# Altium footprint library Led & Displays.PcbLib: 52 footprints (part 3 of 4)
Each footprint in its own frame and in the unit in brackets; x right, y up, seen from the top. Pads: shape width x height; smd on the part's side, far side on the other; paste and mask are expansions set on the pad; w line width, h text height; cw(c..) or ccw(c..) is an arc to the next point about the centre after c.
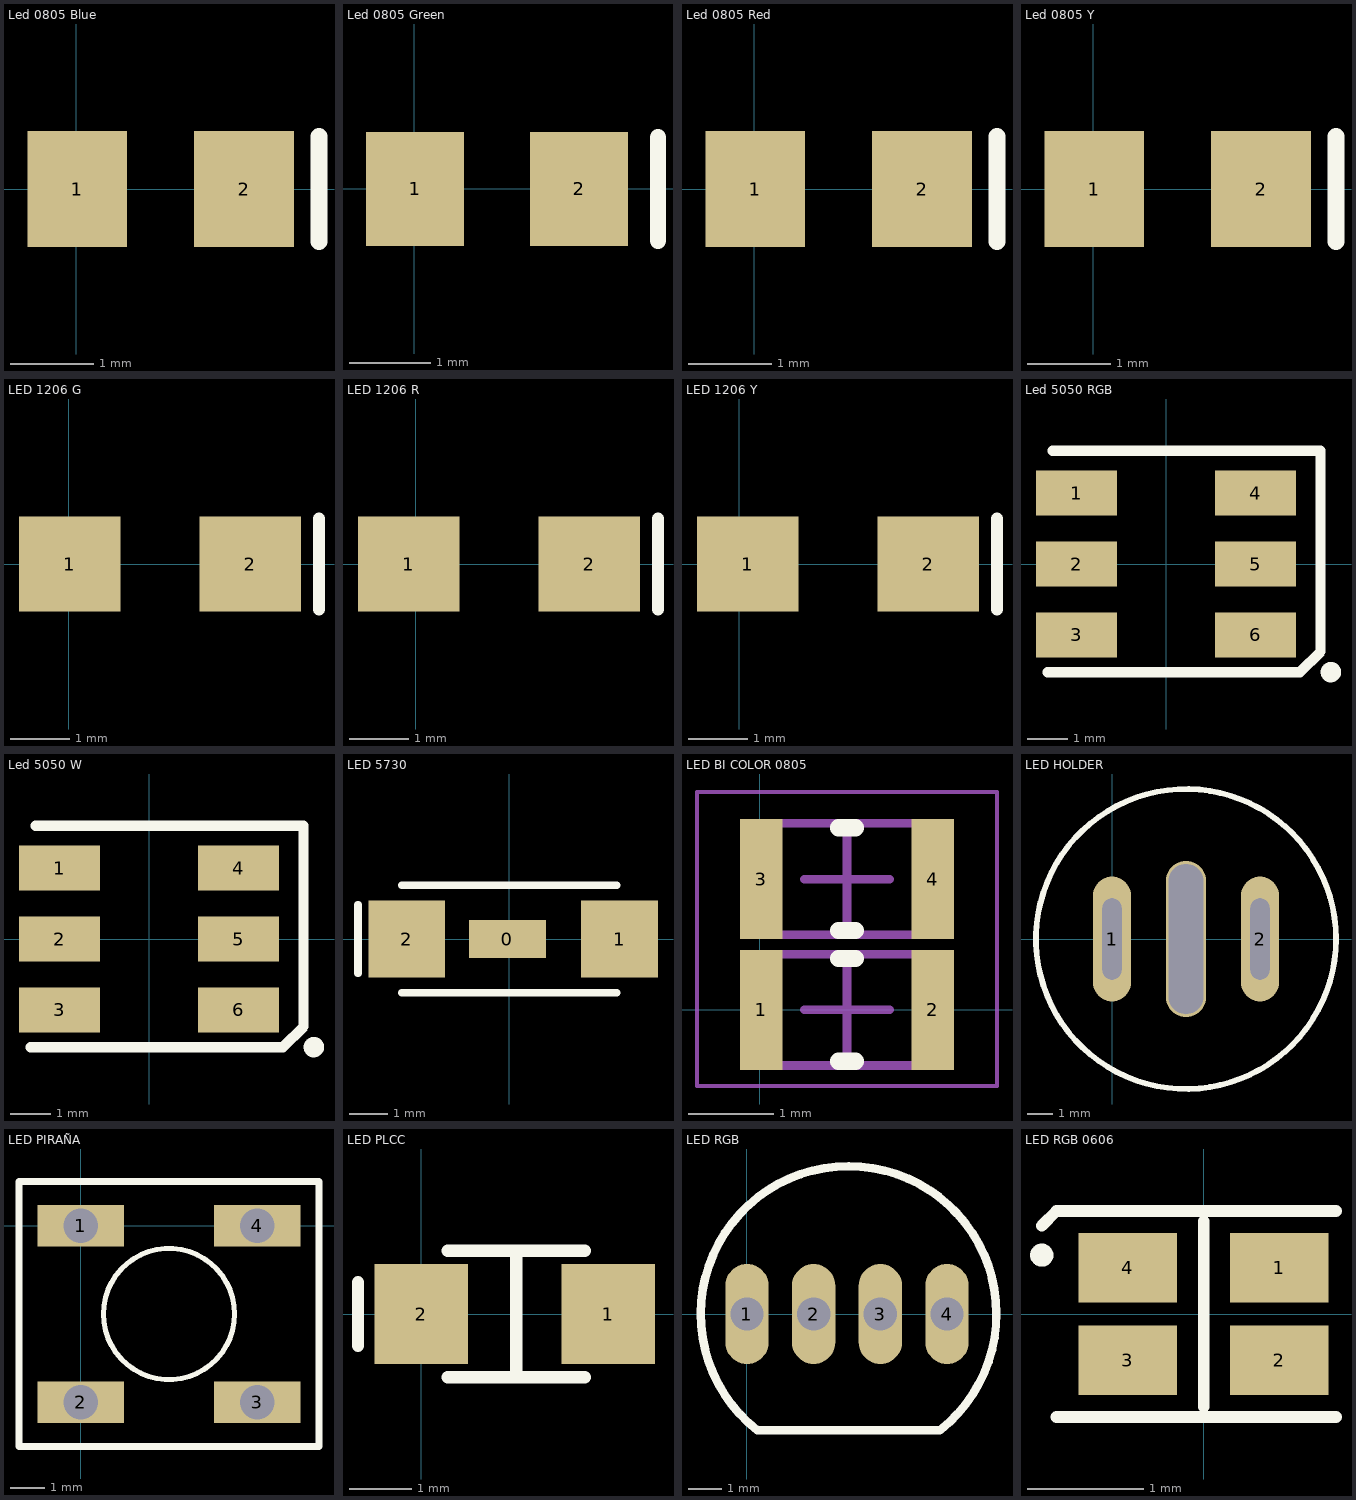
[diagram p2: the footprints below, top view; thin cyan lines are the x and y axes]

## Led 0805 Blue [mm] "Led SMD 0805 Azul"
pads (2):
  rect 1.2x1.4 smd: 1(0.012,0) 2(2.02,0)
Top Overlay:
  lines w0.2: 2.921,-0.635 2.921,0.635
3D body "l0805blue.step": height 1.13, standoff 0.02, extent 0.016,-0.625 2.016,0.625

## Led 0805 Green [mm] "Led SMD 0805 Verde"
pads (2):
  rect 1.2x1.4 smd: 1(0.012,0) 2(2.02,0)
Top Overlay:
  lines w0.2: 2.984,-0.635 2.984,0.635
3D body "l0805g.step": height 1.13, standoff 0.02, extent 0.016,-0.625 2.016,0.625

## Led 0805 Red [mm] "Led SMD 0805 Rojo"
pads (2):
  rect 1.2x1.4 smd: 1(0.012,0) 2(2.02,0)
Top Overlay:
  lines w0.2: 2.921,-0.635 2.921,0.635
3D body "l0805r.step": height 1.13, standoff 0.02, extent 0.016,-0.625 2.016,0.625

## Led 0805 Y [mm] "Led SMD 0805"
pads (2):
  rect 1.2x1.4 smd: 1(0.012,0) 2(2.02,0)
Top Overlay:
  lines w0.2: 2.921,-0.635 2.921,0.635
3D body "LED 0805.step": height 1.1, standoff 0, extent 0.006,-0.625 2.026,0.625

## LED 1206 G [mm] "Led SMD 1206"
pads (2):
  rect 1.7x1.6 smd: 1(0.012,0) 2(3.036,0)
Top Overlay:
  lines w0.2: 4.191,-0.762 4.191,0.762
3D body "LED 1206 BLUE.step": height 1.1, standoff 0, extent -0.203,-0.8 2.997,0.8

## LED 1206 R [mm]
pads (2):
  rect 1.7x1.6 smd: 1(-0.115,0) 2(2.909,0)
Top Overlay:
  lines w0.2: 4.064,-0.762 4.064,0.762
3D body "LED1206R.STEP": height 1.11, standoff -0.4, extent -0.203,-0.787 2.997,0.813

## LED 1206 Y [mm]
pads (2):
  rect 1.7x1.6 smd: 1(0.139,0) 2(3.163,0)
Top Overlay:
  lines w0.2: 4.318,-0.762 4.318,0.762
3D body "LED1206Y.STEP": height 1.11, standoff -0.4, extent 0.051,-0.787 3.251,0.813

## Led 5050 RGB [mm] "Led 5050 RGB"
pads (6):
  rect 2x1.1 smd: 1(-2.208,1.75) 2(-2.208,0) 3(-2.208,-1.75) 4(2.208,1.75) 5(2.208,0) 6(2.208,-1.75)
Top Overlay:
  circle w0.25: c4.064,-2.667 r0.127
  lines w0.254: -2.921,-2.667 3.302,-2.667 3.81,-2.159 3.81,2.794 -2.794,2.794
3D body "Led 5050 RGB.STEP": height 1.6, standoff 0, extent -2.77,-2.54 2.77,2.56

## Led 5050 W [mm] "Led 5050 W"
pads (6):
  rect 2x1.1 smd: 1(-2.208,1.75) 2(-2.208,0) 3(-2.208,-1.75) 4(2.208,1.75) 5(2.208,0) 6(2.208,-1.75)
Top Overlay:
  circle w0.25: c4.064,-2.667 r0.127
  lines w0.254: -2.921,-2.667 3.302,-2.667 3.81,-2.159 3.81,2.794 -2.794,2.794
3D body "Led 5050 W.step": height 1.6, standoff 0, extent -2.54,-2.5 2.76,2.5

## LED 5730 [mm] "SMD LED"
pads (3):
  rect 2x1 smd: 0(-0.048,0)
  rect 2x2 smd: 1(2.873,0) 2(-2.667,0)
Top Overlay:
  lines w0.2: -3.937,-0.889 -3.937,0.889 ; -2.794,-1.397 2.794,-1.397 ; -2.794,1.397 2.794,1.397
3D body "LED 5730 SMD.step": height 0.9, standoff 0, extent -2.85,-1.5 2.85,1.5

## LED BI COLOR 0805 [mm] "LED ROJO-VERDE 0805"
pads (4):
  rect 0.5x1.4 smd: 1(0.016,0) 2(2.016,0) 3(0.016,1.524) 4(2.016,1.524)
Top Overlay:
  lines w0.2: 0.916,-0.6 1.116,-0.6 ; 0.916,0.6 1.116,0.6 ; 0.916,0.924 1.116,0.924 ; 0.916,2.124 1.116,2.124
Mechanical 13:
  lines w0.1: -0.034,-0.65 2.066,-0.65 2.066,0.65 -0.034,0.65 -0.034,-0.65 ; -0.034,0.874 2.066,0.874 2.066,2.174 -0.034,2.174 -0.034,0.874
Mechanical 15:
  lines w0.05: -0.734,0.95 -0.734,-0.889 2.766,-0.889 2.766,0.95 ; -0.734,0.955 -0.734,2.54 2.766,2.54 2.766,0.955
  lines w0.1: 0.516,0 1.516,0 ; 0.516,1.524 1.516,1.524 ; 1.016,-0.5 1.016,0.5 ; 1.016,1.024 1.016,2.024
3D body: height 0.1, standoff 0, extent 1.536,0.874 2.066,2.174
3D body: height 0.1, standoff 0, extent -0.034,0.874 0.496,2.174
3D body: height 0.1, standoff 0, extent 1.536,-0.65 2.066,0.65
3D body: height 0.1, standoff 0, extent -0.034,-0.65 0.496,0.65
3D body: height 0.67, standoff 0.1, extent 0.127,-0.762 1.778,2.413

## LED HOLDER [mm] "HOLDER LED 5mm"
pads (3):
  oval 1.524x5 hole 0.762 slot 3.25 at 90 deg: 1(0,0) 2(5.92,0)
  oval 1.6x6.25 hole 1.4 slot 6 at 90 deg: ""(2.96,0)
Top Overlay:
  circle w0.23: c2.96,0 r6
3D body "Holder with Green LED L-609G.STEP": height 15.2, standoff -15.2, extent -2.508,-5.251 8.492,6.249

## LED PIRAÑA [mm] "LED PIRAÑA"
height 5
pads (4):
  rect 2.5x1.2 hole 1: 1(0,0) 2(0,-5.08) 3(5.08,-5.08) 4(5.08,0)
Top Overlay:
  circle w0.15: c2.54,-2.54 r1.888
  lines w0.2: -1.778,-6.35 -1.778,1.27 6.858,1.27 6.858,-6.35 -1.778,-6.35
3D body "LED AZUL PIRAÑA.STEP": height 5.5, standoff -4.5, extent -1.324,-6.35 6.296,1.27

## LED PLCC [mm] "Led PLCC SMD 2.2x1.4"
pads (2):
  rect 1.5x1.6 smd: 1(3,0) 2(0,0)
Top Overlay:
  lines w0.2: -1.016,-0.508 -1.016,0.508 ; 0.424,-1.016 2.624,-1.016 ; 0.424,1.016 2.624,1.016 ; 1.524,-1.016 1.524,1.016
3D body "PLCC2-2_2x1_4.step": height 1.35, standoff 0.05, extent 0.424,-0.7 2.624,0.7

## LED RGB [mm] "LED RGB 5mm"
height 5
pads (4):
  oval 1.3x3 hole 1: 1(0,0) 2(2,0) 3(4,0) 4(6,0)
Top Overlay:
  lines w0.254: 0.307,-3.488 cw(c3.048,0) 5.789,-3.488 ; 0.307,-3.488 5.789,-3.488
3D body: height 12.5, standoff 2.5, extent -2.027,-5.106 7.921,4.852
3D body: height 7.5, standoff 0.5, extent -2.039,-4.99 7.921,4.99
3D body: height 2, standoff -2, extent 5.504,-0.499 6.5,0.499
3D body: height 2, standoff -2, extent 3.504,-0.499 4.5,0.499
3D body: height 2, standoff -3, extent 1.504,-0.499 2.5,0.499
3D body: height 2, standoff -2, extent -0.496,-0.499 0.5,0.499

## LED RGB 0606 [mm] "SMD Led RGB 0606"
pads (4):
  rect 0.85x0.6 smd: 1(0.655,0.401) 2(0.655,-0.401) 3(-0.655,-0.401) 4(-0.655,0.401)
Top Overlay:
  circle w0.1: c-1.397,0.508 r0.05
  lines w0.1: -1.397,0.762 -1.27,0.889 1.143,0.889 ; -1.27,-0.889 1.143,-0.889 ; 0,-0.8 0,0.8
3D body "RGB LED 0606.step": height 0.35, standoff -0.01, extent -0.8,-0.8 0.8,0.8